# Altium integrated library WE_WR-MPC3_Micro Power Connector_3.00 mm_rev15c.IntLib: 173 symbols (part 2 of 2)
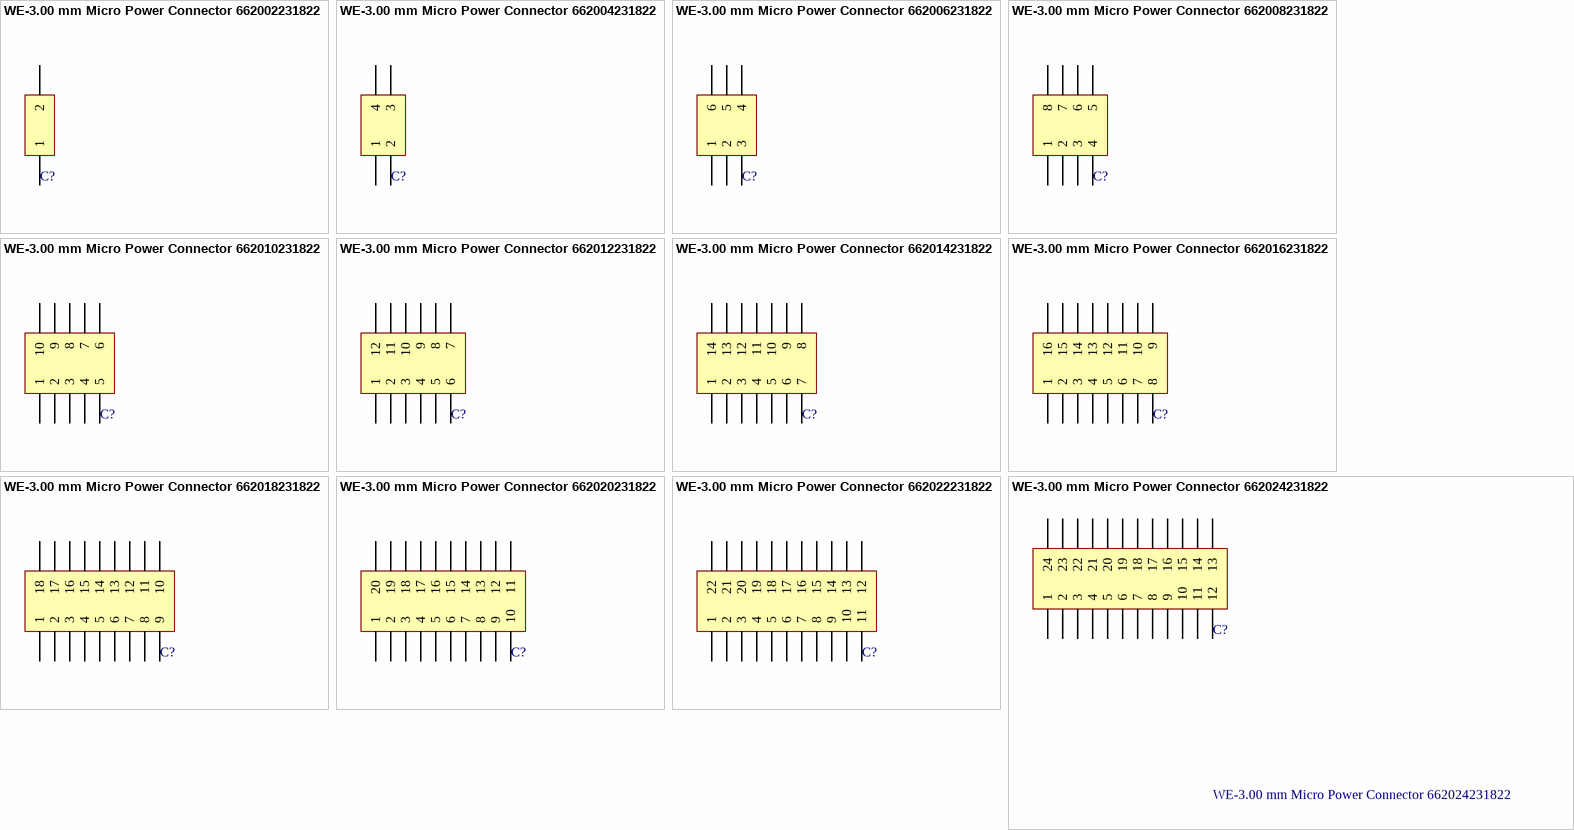
[diagram p17: symbols WE-3.00 mm Micro Power Connector 662002231822 to WE-3.00 mm Micro Power Connector 662024231822]

## WE-3.00 mm Micro Power Connector 662002231822
designator C?
WR-MPC3 3.00 mm Male Dual Row SMT Vertical Header with SMT Solder Tab; Manufacturer: Würth Elektronik eiSos GmbH; ComponentLink1 Description: Manufacturer; ComponentLink2 Description: Datasheet; NoPins: 02; Created Date: 30 July 2013; partNo: 662002231822; ComponentLink1URL: http://www.we-online.com; ComponentLink2URL: http://katalog.we-online.de/em/datasheet/6620xx231822.pdf; Created by: Karrer Zheng
footprint 662002231822 (Dual row SMT Vertical header With SMT Solder Tab 02p)
pins: 1, 2

## WE-3.00 mm Micro Power Connector 662004231822
designator C?
WR-MPC3 3.00 mm Male Dual Row SMT Vertical Header with SMT Solder Tab; Manufacturer: Würth Elektronik eiSos GmbH; ComponentLink1 Description: Manufacturer; ComponentLink2 Description: Datasheet; NoPins: 04; Created Date: 30 July 2013; partNo: 662004231822; ComponentLink1URL: http://www.we-online.com; ComponentLink2URL: http://katalog.we-online.de/em/datasheet/6620xx231822.pdf; Created by: Karrer Zheng
footprint 662004231822 (Dual row SMT Vertical header With SMT Solder Tab 04p)
pins: 1, 2, 3, 4

## WE-3.00 mm Micro Power Connector 662006231822
designator C?
WR-MPC3 3.00 mm Male Dual Row SMT Vertical Header with SMT Solder Tab; Manufacturer: Würth Elektronik eiSos GmbH; ComponentLink1 Description: Manufacturer; ComponentLink2 Description: Datasheet; NoPins: 06; Created Date: 30 July 2013; partNo: 662006231822; ComponentLink1URL: http://www.we-online.com; ComponentLink2URL: http://katalog.we-online.de/em/datasheet/6620xx231822.pdf; Created by: Karrer Zheng
footprint 662006231822 (Dual row SMT Vertical header With SMT Solder Tab 06p)
pins: 1, 2, 3, 4, 5, 6

## WE-3.00 mm Micro Power Connector 662008231822
designator C?
WR-MPC3 3.00 mm Male Dual Row SMT Vertical Header with SMT Solder Tab; Manufacturer: Würth Elektronik eiSos GmbH; ComponentLink1 Description: Manufacturer; ComponentLink2 Description: Datasheet; NoPins: 08; Created Date: 30 July 2013; partNo: 662008231822; ComponentLink1URL: http://www.we-online.com; ComponentLink2URL: http://katalog.we-online.de/em/datasheet/6620xx231822.pdf; Created by: Karrer Zheng
footprint 662008231822 (Dual row SMT Vertical header With SMT Solder Tab 08p)
pins: 1, 2, 3, 4, 5, 6, 7, 8

## WE-3.00 mm Micro Power Connector 662010231822
designator C?
WR-MPC3 3.00 mm Male Dual Row SMT Vertical Header with SMT Solder Tab; Manufacturer: Würth Elektronik eiSos GmbH; ComponentLink1 Description: Manufacturer; ComponentLink2 Description: Datasheet; NoPins: 10; Created Date: 30 July 2013; partNo: 662010231822; ComponentLink1URL: http://www.we-online.com; ComponentLink2URL: http://katalog.we-online.de/em/datasheet/6620xx231822.pdf; Created by: Karrer Zheng
footprint 662010231822 (Dual row SMT Vertical header With SMT Solder Tab 10p)
pins: 1, 2, 3, 4, 5, 6, 7, 8, 9, 10

## WE-3.00 mm Micro Power Connector 662012231822
designator C?
WR-MPC3 3.00 mm Male Dual Row SMT Vertical Header with SMT Solder Tab; Manufacturer: Würth Elektronik eiSos GmbH; ComponentLink1 Description: Manufacturer; ComponentLink2 Description: Datasheet; NoPins: 12; Created Date: 30 July 2013; partNo: 662012231822; ComponentLink1URL: http://www.we-online.com; ComponentLink2URL: http://katalog.we-online.de/em/datasheet/6620xx231822.pdf; Created by: Karrer Zheng
footprint 662012231822 (Dual row SMT Vertical header With SMT Solder Tab 12p)
pins: 1, 2, 3, 4, 5, 6, 7, 8, 9, 10, 11, 12

## WE-3.00 mm Micro Power Connector 662014231822
designator C?
WR-MPC3 3.00 mm Male Dual Row SMT Vertical Header with SMT Solder Tab; Manufacturer: Würth Elektronik eiSos GmbH; ComponentLink1 Description: Manufacturer; ComponentLink2 Description: Datasheet; NoPins: 14; Created Date: 30 July 2013; partNo: 662014231822; ComponentLink1URL: http://www.we-online.com; ComponentLink2URL: http://katalog.we-online.de/em/datasheet/6620xx231822.pdf; Created by: Karrer Zheng
footprint 662014231822 (Dual row SMT Vertical header With SMT Solder Tab 14p)
pins: 1, 2, 3, 4, 5, 6, 7, 8, 9, 10, 11, 12, 13, 14

## WE-3.00 mm Micro Power Connector 662016231822
designator C?
WR-MPC3 3.00 mm Male Dual Row SMT Vertical Header with SMT Solder Tab; Manufacturer: Würth Elektronik eiSos GmbH; ComponentLink1 Description: Manufacturer; ComponentLink2 Description: Datasheet; NoPins: 16; Created Date: 30 July 2013; partNo: 662016231822; ComponentLink1URL: http://www.we-online.com; ComponentLink2URL: http://katalog.we-online.de/em/datasheet/6620xx231822.pdf; Created by: Karrer Zheng
footprint 662016231822 (Dual row SMT Vertical header With SMT Solder Tab 16p)
pins: 1, 2, 3, 4, 5, 6, 7, 8, 9, 10, 11, 12, 13, 14, 15, 16

## WE-3.00 mm Micro Power Connector 662018231822
designator C?
WR-MPC3 3.00 mm Male Dual Row SMT Vertical Header with SMT Solder Tab; Manufacturer: Würth Elektronik eiSos GmbH; ComponentLink1 Description: Manufacturer; ComponentLink2 Description: Datasheet; NoPins: 18; Created Date: 30 July 2013; partNo: 662018231822; ComponentLink1URL: http://www.we-online.com; ComponentLink2URL: http://katalog.we-online.de/em/datasheet/6620xx231822.pdf; Created by: Karrer Zheng
footprint 662018231822 (Dual row SMT Vertical header With SMT Solder Tab 18p)
pins: 1, 2, 3, 4, 5, 6, 7, 8, 9, 10, 11, 12, 13, 14, 15, 16, 17, 18

## WE-3.00 mm Micro Power Connector 662020231822
designator C?
WR-MPC3 3.00 mm Male Dual Row SMT Vertical Header with SMT Solder Tab; Manufacturer: Würth Elektronik eiSos GmbH; ComponentLink1 Description: Manufacturer; ComponentLink2 Description: Datasheet; NoPins: 20; Created Date: 30 July 2013; partNo: 662020231822; ComponentLink1URL: http://www.we-online.com; ComponentLink2URL: http://katalog.we-online.de/em/datasheet/6620xx231822.pdf; Created by: Karrer Zheng
footprint 662020231822 (Dual row SMT Vertical header With SMT Solder Tab 20p)
pins: 1, 2, 3, 4, 5, 6, 7, 8, 9, 10, 11, 12, 13, 14, 15, 16, 17, 18, 19, 20

## WE-3.00 mm Micro Power Connector 662022231822
designator C?
WR-MPC3 3.00 mm Male Dual Row SMT Vertical Header with SMT Solder Tab; Manufacturer: Würth Elektronik eiSos GmbH; ComponentLink1 Description: Manufacturer; ComponentLink2 Description: Datasheet; NoPins: 22; Created Date: 30 July 2013; partNo: 662022231822; ComponentLink1URL: http://www.we-online.com; ComponentLink2URL: http://katalog.we-online.de/em/datasheet/6620xx231822.pdf; Created by: Karrer Zheng
footprint 662022231822 (Dual row SMT Vertical header With SMT Solder Tab 22p)
pins: 1, 2, 3, 4, 5, 6, 7, 8, 9, 10, 11, 12, 13, 14, 15, 16, 17, 18, 19, 20, 21, 22

## WE-3.00 mm Micro Power Connector 662024231822
designator C?
WR-MPC3 3.00 mm Male Dual Row SMT Vertical Header with SMT Solder Tab; Manufacturer: Würth Elektronik eiSos GmbH; ComponentLink1 Description: Manufacturer; ComponentLink2 Description: Datasheet; NoPins: 24; Created Date: 30 July 2013; partNo: 662024231822; ComponentLink1URL: http://www.we-online.com; ComponentLink2URL: http://katalog.we-online.de/em/datasheet/6620xx231822.pdf; Created by: Karrer Zheng
footprint 662024231822 (Dual row SMT Vertical header With SMT Solder Tab 24p)
pins: 1, 2, 3, 4, 5, 6, 7, 8, 9, 10, 11, 12, 13, 14, 15, 16, 17, 18, 19, 20, 21, 22, 23, 24


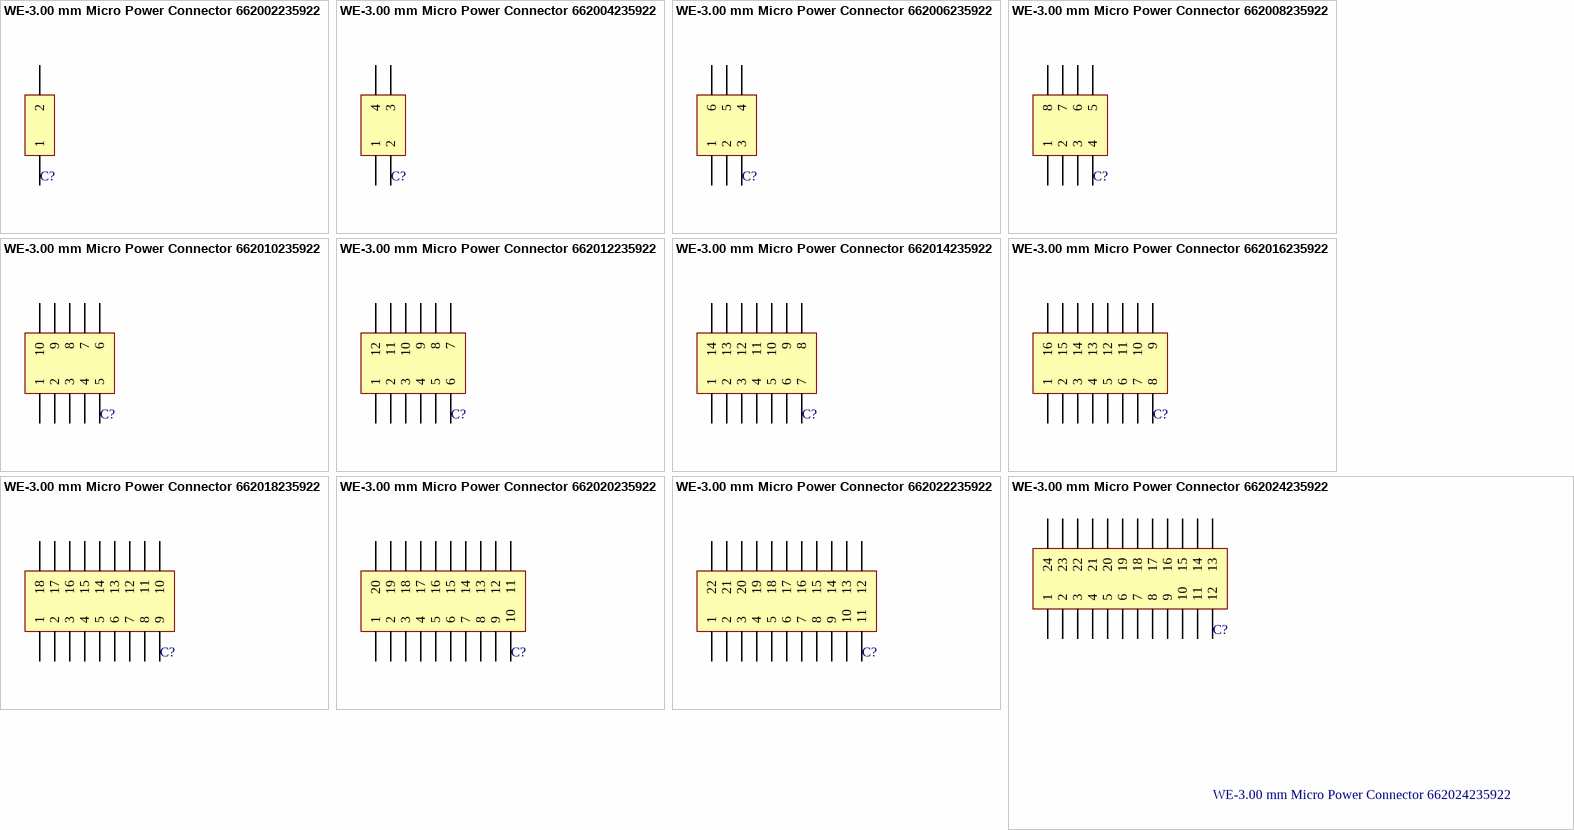
[diagram p14: symbols WE-3.00 mm Micro Power Connector 662002235922 to WE-3.00 mm Micro Power Connector 662024235922]

## WE-3.00 mm Micro Power Connector 662002235922
designator C?
WR-MPC3 3.00 mm Male Dual Row SMT Vertical Header with Through Hole Retention Clip; Manufacturer: Würth Elektronik eiSos GmbH; ComponentLink1 Description: Manufacturer; ComponentLink2 Description: Datasheet; NoPins: 02; Created Date: 30 July 2013; partNo: 662002235922; ComponentLink1URL: http://www.we-online.com; ComponentLink2URL: http://katalog.we-online.de/em/datasheet/6620xx235922.pdf; Created by: Karrer Zheng
footprint 662002235922 (Dual row SMT Vertical header With TH metal clip 02p)
pins: 1, 2

## WE-3.00 mm Micro Power Connector 662004235922
designator C?
WR-MPC3 3.00 mm Male Dual Row SMT Vertical Header with Through Hole Retention Clip; Manufacturer: Würth Elektronik eiSos GmbH; ComponentLink1 Description: Manufacturer; ComponentLink2 Description: Datasheet; NoPins: 04; Created Date: 30 July 2013; partNo: 662004235922; ComponentLink1URL: http://www.we-online.com; ComponentLink2URL: http://katalog.we-online.de/em/datasheet/6620xx235922.pdf; Created by: Karrer Zheng
footprint 662004235922 (Dual row SMT Vertical header With TH metal clip 04p)
pins: 1, 2, 3, 4

## WE-3.00 mm Micro Power Connector 662006235922
designator C?
WR-MPC3 3.00 mm Male Dual Row SMT Vertical Header with Through Hole Retention Clip; Manufacturer: Würth Elektronik eiSos GmbH; ComponentLink1 Description: Manufacturer; ComponentLink2 Description: Datasheet; NoPins: 6; Created Date: 30 July 2013; partNo: 662006235922; ComponentLink1URL: http://www.we-online.com; ComponentLink2URL: http://katalog.we-online.de/em/datasheet/6620xx235922.pdf; Created by: Karrer Zheng
footprint 662006235922 (Dual row SMT Vertical header With TH metal clip 06p)
pins: 1, 2, 3, 4, 5, 6

## WE-3.00 mm Micro Power Connector 662008235922
designator C?
WR-MPC3 3.00 mm Male Dual Row SMT Vertical Header with Through Hole Retention Clip; Manufacturer: Würth Elektronik eiSos GmbH; ComponentLink1 Description: Manufacturer; ComponentLink2 Description: Datasheet; NoPins: 08; Created Date: 30 July 2013; partNo: 662008235922; ComponentLink1URL: http://www.we-online.com; ComponentLink2URL: http://katalog.we-online.de/em/datasheet/6620xx235922.pdf; Created by: Karrer Zheng
footprint 662008235922 (Dual row SMT Vertical header With TH metal clip 08p)
pins: 1, 2, 3, 4, 5, 6, 7, 8

## WE-3.00 mm Micro Power Connector 662010235922
designator C?
WR-MPC3 3.00 mm Male Dual Row SMT Vertical Header with Through Hole Retention Clip; Manufacturer: Würth Elektronik eiSos GmbH; ComponentLink1 Description: Manufacturer; ComponentLink2 Description: Datasheet; NoPins: 10; Created Date: 30 July 2013; partNo: 662010235922; ComponentLink1URL: http://www.we-online.com; ComponentLink2URL: http://katalog.we-online.de/em/datasheet/6620xx235922.pdf; Created by: Karrer Zheng
footprint 662010235922 (Dual row SMT Vertical header With TH metal clip 10p)
pins: 1, 2, 3, 4, 5, 6, 7, 8, 9, 10

## WE-3.00 mm Micro Power Connector 662012235922
designator C?
WR-MPC3 3.00 mm Male Dual Row SMT Vertical Header with Through Hole Retention Clip; Manufacturer: Würth Elektronik eiSos GmbH; ComponentLink1 Description: Manufacturer; ComponentLink2 Description: Datasheet; NoPins: 12; Created Date: 30 July 2013; partNo: 662012235922; ComponentLink1URL: http://www.we-online.com; ComponentLink2URL: http://katalog.we-online.de/em/datasheet/6620xx235922.pdf; Created by: Karrer Zheng
footprint 662012235922 (Dual row SMT Vertical header With TH metal clip 12p)
pins: 1, 2, 3, 4, 5, 6, 7, 8, 9, 10, 11, 12

## WE-3.00 mm Micro Power Connector 662014235922
designator C?
WR-MPC3 3.00 mm Male Dual Row SMT Vertical Header with Through Hole Retention Clip; Manufacturer: Würth Elektronik eiSos GmbH; ComponentLink1 Description: Manufacturer; ComponentLink2 Description: Datasheet; NoPins: 14; Created Date: 30 July 2013; partNo: 662014235922; ComponentLink1URL: http://www.we-online.com; ComponentLink2URL: http://katalog.we-online.de/em/datasheet/6620xx235922.pdf; Created by: Karrer Zheng
footprint 662014235922 (Dual row SMT Vertical header With TH metal clip 14p)
pins: 1, 2, 3, 4, 5, 6, 7, 8, 9, 10, 11, 12, 13, 14

## WE-3.00 mm Micro Power Connector 662016235922
designator C?
WR-MPC3 3.00 mm Male Dual Row SMT Vertical Header with Through Hole Retention Clip; Manufacturer: Würth Elektronik eiSos GmbH; ComponentLink1 Description: Manufacturer; ComponentLink2 Description: Datasheet; NoPins: 16; Created Date: 30 July 2013; partNo: 662016235922; ComponentLink1URL: http://www.we-online.com; ComponentLink2URL: http://katalog.we-online.de/em/datasheet/6620xx235922.pdf; Created by: Karrer Zheng
footprint 662016235922 (Dual row SMT Vertical header With TH metal clip 16p)
pins: 1, 2, 3, 4, 5, 6, 7, 8, 9, 10, 11, 12, 13, 14, 15, 16

## WE-3.00 mm Micro Power Connector 662018235922
designator C?
WR-MPC3 3.00 mm Male Dual Row SMT Vertical Header with Through Hole Retention Clip; Manufacturer: Würth Elektronik eiSos GmbH; ComponentLink1 Description: Manufacturer; ComponentLink2 Description: Datasheet; NoPins: 18; Created Date: 30 July 2013; partNo: 662018235922; ComponentLink1URL: http://www.we-online.com; ComponentLink2URL: http://katalog.we-online.de/em/datasheet/6620xx235922.pdf; Created by: Karrer Zheng
footprint 662018235922 (Dual row SMT Vertical header With TH metal clip 18p)
pins: 1, 2, 3, 4, 5, 6, 7, 8, 9, 10, 11, 12, 13, 14, 15, 16, 17, 18

## WE-3.00 mm Micro Power Connector 662020235922
designator C?
WR-MPC3 3.00 mm Male Dual Row SMT Vertical Header with Through Hole Retention Clip; Manufacturer: Würth Elektronik eiSos GmbH; ComponentLink1 Description: Manufacturer; ComponentLink2 Description: Datasheet; NoPins: 20; Created Date: 30 July 2013; partNo: 662020235922; ComponentLink1URL: http://www.we-online.com; ComponentLink2URL: http://katalog.we-online.de/em/datasheet/6620xx235922.pdf; Created by: Karrer Zheng
footprint 662020235922 (Dual row SMT Vertical header With TH metal clip 20p)
pins: 1, 2, 3, 4, 5, 6, 7, 8, 9, 10, 11, 12, 13, 14, 15, 16, 17, 18, 19, 20

## WE-3.00 mm Micro Power Connector 662022235922
designator C?
WR-MPC3 3.00 mm Male Dual Row SMT Vertical Header with Through Hole Retention Clip; Manufacturer: Würth Elektronik eiSos GmbH; ComponentLink1 Description: Manufacturer; ComponentLink2 Description: Datasheet; NoPins: 22; Created Date: 30 July 2013; partNo: 662022235922; ComponentLink1URL: http://www.we-online.com; ComponentLink2URL: http://katalog.we-online.de/em/datasheet/6620xx235922.pdf; Created by: Karrer Zheng
footprint 662022235922 (Dual row SMT Vertical header With TH metal clip 22p)
pins: 1, 2, 3, 4, 5, 6, 7, 8, 9, 10, 11, 12, 13, 14, 15, 16, 17, 18, 19, 20, 21, 22

## WE-3.00 mm Micro Power Connector 662024235922
designator C?
WR-MPC3 3.00 mm Male Dual Row SMT Vertical Header with Through Hole Retention Clip; Manufacturer: Würth Elektronik eiSos GmbH; ComponentLink1 Description: Manufacturer; ComponentLink2 Description: Datasheet; NoPins: 24; Created Date: 30 July 2013; partNo: 662024235922; ComponentLink1URL: http://www.we-online.com; ComponentLink2URL: http://katalog.we-online.de/em/datasheet/6620xx235922.pdf; Created by: Karrer Zheng
footprint 662024235922 (Dual row SMT Vertical header With TH metal clip 24p)
pins: 1, 2, 3, 4, 5, 6, 7, 8, 9, 10, 11, 12, 13, 14, 15, 16, 17, 18, 19, 20, 21, 22, 23, 24


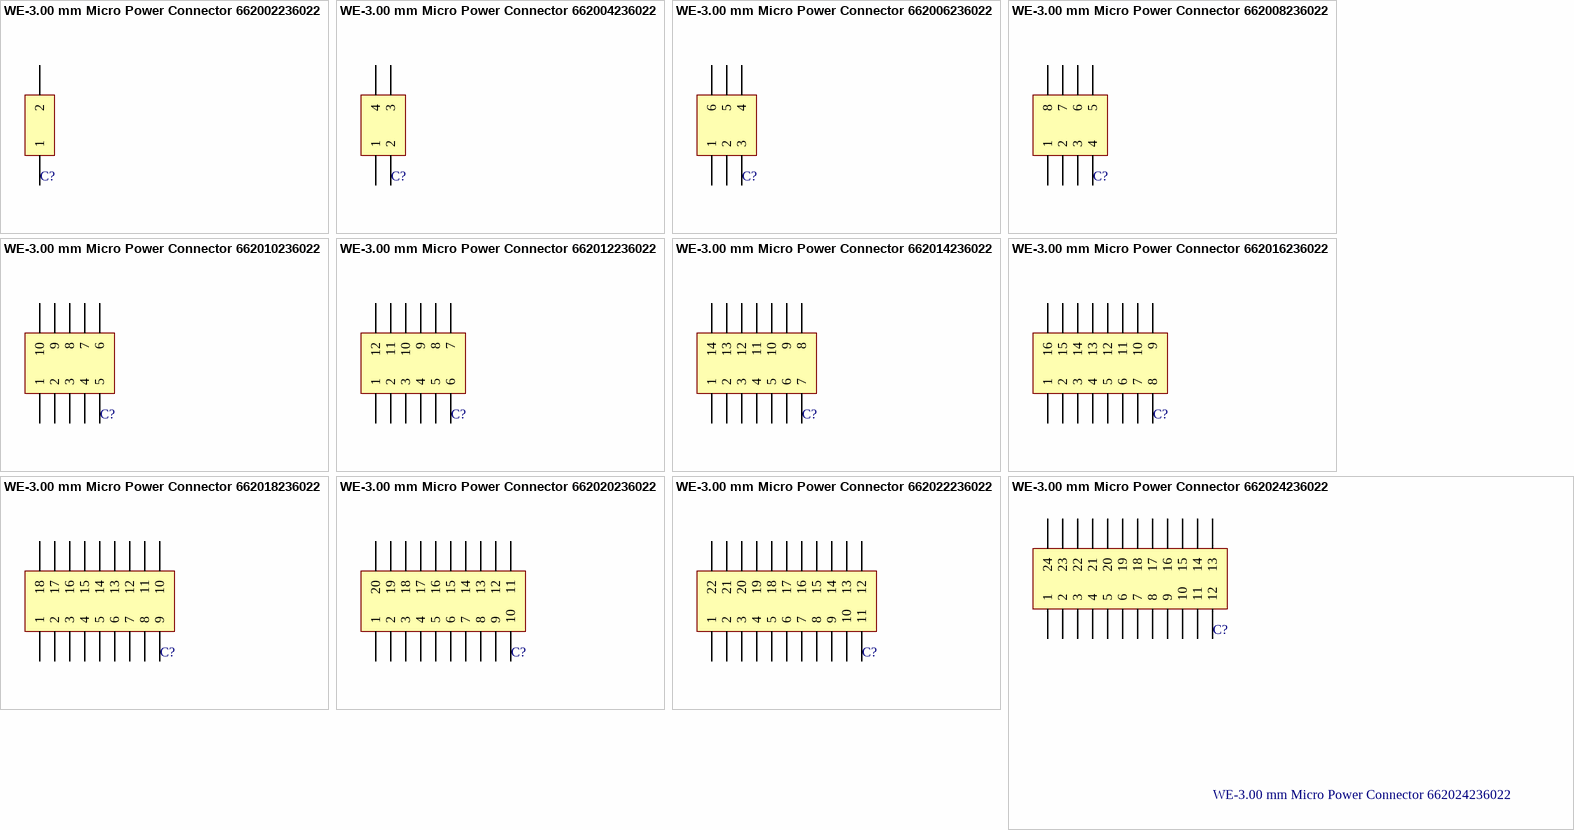
[diagram p15: symbols WE-3.00 mm Micro Power Connector 662002236022 to WE-3.00 mm Micro Power Connector 662024236022]

## WE-3.00 mm Micro Power Connector 662002236022
designator C?
WR-MPC3 3.00 mm Male Dual Row SMT Angled Header with Plastic Pegs; Manufacturer: Würth Elektronik eiSos GmbH; ComponentLink1 Description: Manufacturer; ComponentLink2 Description: Datasheet; NoPins: 02; Created Date: 20 August 2013; partNo: 662002236022; ComponentLink1URL: http://www.we-online.com; ComponentLink2URL: http://katalog.we-online.de/em/datasheet/6620xx236022.pdf; Created by: Karrer Zheng
footprint 662002236022 (Dual row SMT Right angle header With plastic peg 02p)
pins: 1, 2

## WE-3.00 mm Micro Power Connector 662004236022
designator C?
WR-MPC3 3.00 mm Male Dual Row SMT Angled Header with Plastic Pegs; Manufacturer: Würth Elektronik eiSos GmbH; ComponentLink1 Description: Manufacturer; ComponentLink2 Description: Datasheet; NoPins: 04; Created Date: 20 August 2013; partNo: 662004236022; ComponentLink1URL: http://www.we-online.com; ComponentLink2URL: http://katalog.we-online.de/em/datasheet/6620xx236022.pdf; Created by: Karrer Zheng
footprint 662004236022 (Dual row SMT Right angle header With plastic peg 04p)
pins: 1, 2, 3, 4

## WE-3.00 mm Micro Power Connector 662006236022
designator C?
WR-MPC3 3.00 mm Male Dual Row SMT Angled Header with Plastic Pegs; Manufacturer: Würth Elektronik eiSos GmbH; ComponentLink1 Description: Manufacturer; ComponentLink2 Description: Datasheet; NoPins: 06; Created Date: 20 August 2013; partNo: 662006236022; ComponentLink1URL: http://www.we-online.com; ComponentLink2URL: http://katalog.we-online.de/em/datasheet/6620xx236022.pdf; Created by: Karrer Zheng
footprint 662006236022 (Dual row SMT Right angle header With plastic peg 06p)
pins: 1, 2, 3, 4, 5, 6

## WE-3.00 mm Micro Power Connector 662008236022
designator C?
WR-MPC3 3.00 mm Male Dual Row SMT Angled Header with Plastic Pegs; Manufacturer: Würth Elektronik eiSos GmbH; ComponentLink1 Description: Manufacturer; ComponentLink2 Description: Datasheet; NoPins: 08; Created Date: 20 August 2013; partNo: 662008236022; ComponentLink1URL: http://www.we-online.com; ComponentLink2URL: http://katalog.we-online.de/em/datasheet/6620xx236022.pdf; Created by: Karrer Zheng
footprint 662008236022 (Dual row SMT Right angle header With plastic peg 08p)
pins: 1, 2, 3, 4, 5, 6, 7, 8

## WE-3.00 mm Micro Power Connector 662010236022
designator C?
WR-MPC3 3.00 mm Male Dual Row SMT Angled Header with Plastic Pegs; Manufacturer: Würth Elektronik eiSos GmbH; ComponentLink1 Description: Manufacturer; ComponentLink2 Description: Datasheet; NoPins: 10; Created Date: 20 August 2013; partNo: 662010236022; ComponentLink1URL: http://www.we-online.com; ComponentLink2URL: http://katalog.we-online.de/em/datasheet/6620xx236022.pdf; Created by: Karrer Zheng
footprint 662010236022 (Dual row SMT Right angle header With plastic peg 10p)
pins: 1, 2, 3, 4, 5, 6, 7, 8, 9, 10

## WE-3.00 mm Micro Power Connector 662012236022
designator C?
WR-MPC3 3.00 mm Male Dual Row SMT Angled Header with Plastic Pegs; Manufacturer: Würth Elektronik eiSos GmbH; ComponentLink1 Description: Manufacturer; ComponentLink2 Description: Datasheet; NoPins: 12; Created Date: 20 August 2013; partNo: 662012236022; ComponentLink1URL: http://www.we-online.com; ComponentLink2URL: http://katalog.we-online.de/em/datasheet/6620xx236022.pdf; Created by: Karrer Zheng
footprint 662012236022 (Dual row SMT Right angle header With plastic peg 12p)
pins: 1, 2, 3, 4, 5, 6, 7, 8, 9, 10, 11, 12

## WE-3.00 mm Micro Power Connector 662014236022
designator C?
WR-MPC3 3.00 mm Male Dual Row SMT Angled Header with Plastic Pegs; Manufacturer: Würth Elektronik eiSos GmbH; ComponentLink1 Description: Manufacturer; ComponentLink2 Description: Datasheet; NoPins: 14; Created Date: 20 August 2013; partNo: 662014236022; ComponentLink1URL: http://www.we-online.com; ComponentLink2URL: http://katalog.we-online.de/em/datasheet/6620xx236022.pdf; Created by: Karrer Zheng
footprint 662014236022 (Dual row SMT Right angle header With plastic peg 14p)
pins: 1, 2, 3, 4, 5, 6, 7, 8, 9, 10, 11, 12, 13, 14

## WE-3.00 mm Micro Power Connector 662016236022
designator C?
WR-MPC3 3.00 mm Male Dual Row SMT Angled Header with Plastic Pegs; Manufacturer: Würth Elektronik eiSos GmbH; ComponentLink1 Description: Manufacturer; ComponentLink2 Description: Datasheet; NoPins: 16; Created Date: 20 August 2013; partNo: 662016236022; ComponentLink1URL: http://www.we-online.com; ComponentLink2URL: http://katalog.we-online.de/em/datasheet/6620xx236022.pdf; Created by: Karrer Zheng
footprint 662016236022 (Dual row SMT Right angle header With plastic peg 16p)
pins: 1, 2, 3, 4, 5, 6, 7, 8, 9, 10, 11, 12, 13, 14, 15, 16

## WE-3.00 mm Micro Power Connector 662018236022
designator C?
WR-MPC3 3.00 mm Male Dual Row SMT Angled Header with Plastic Pegs; Manufacturer: Würth Elektronik eiSos GmbH; ComponentLink1 Description: Manufacturer; ComponentLink2 Description: Datasheet; NoPins: 18; Created Date: 20 August 2013; partNo: 662018236022; ComponentLink1URL: http://www.we-online.com; ComponentLink2URL: http://katalog.we-online.de/em/datasheet/6620xx236022.pdf; Created by: Karrer Zheng
footprint 662018236022 (Dual row SMT Right angle header With plastic peg 18p)
pins: 1, 2, 3, 4, 5, 6, 7, 8, 9, 10, 11, 12, 13, 14, 15, 16, 17, 18

## WE-3.00 mm Micro Power Connector 662020236022
designator C?
WR-MPC3 3.00 mm Male Dual Row SMT Angled Header with Plastic Pegs; Manufacturer: Würth Elektronik eiSos GmbH; ComponentLink1 Description: Manufacturer; ComponentLink2 Description: Datasheet; NoPins: 20; Created Date: 20 August 2013; partNo: 662020236022; ComponentLink1URL: http://www.we-online.com; ComponentLink2URL: http://katalog.we-online.de/em/datasheet/6620xx236022.pdf; Created by: Karrer Zheng
footprint 662020236022 (Dual row SMT Right angle header With plastic peg 20p)
pins: 1, 2, 3, 4, 5, 6, 7, 8, 9, 10, 11, 12, 13, 14, 15, 16, 17, 18, 19, 20

## WE-3.00 mm Micro Power Connector 662022236022
designator C?
WR-MPC3 3.00 mm Male Dual Row SMT Angled Header with Plastic Pegs; Manufacturer: Würth Elektronik eiSos GmbH; ComponentLink1 Description: Manufacturer; ComponentLink2 Description: Datasheet; NoPins: 22; Created Date: 20 August 2013; partNo: 662022236022; ComponentLink1URL: http://www.we-online.com; ComponentLink2URL: http://katalog.we-online.de/em/datasheet/6620xx236022.pdf; Created by: Karrer Zheng
footprint 662022236022 (Dual row SMT Right angle header With plastic peg 22p)
pins: 1, 2, 3, 4, 5, 6, 7, 8, 9, 10, 11, 12, 13, 14, 15, 16, 17, 18, 19, 20, 21, 22

## WE-3.00 mm Micro Power Connector 662024236022
designator C?
WR-MPC3 3.00 mm Male Dual Row SMT Angled Header with Plastic Pegs; Manufacturer: Würth Elektronik eiSos GmbH; ComponentLink1 Description: Manufacturer; ComponentLink2 Description: Datasheet; NoPins: 24; Created Date: 20 August 2013; partNo: 662024236022; ComponentLink1URL: http://www.we-online.com; ComponentLink2URL: http://katalog.we-online.de/em/datasheet/6620xx236022.pdf; Created by: Karrer Zheng
footprint 662024236022 (Dual row SMT Right angle header With plastic peg 24p)
pins: 1, 2, 3, 4, 5, 6, 7, 8, 9, 10, 11, 12, 13, 14, 15, 16, 17, 18, 19, 20, 21, 22, 23, 24


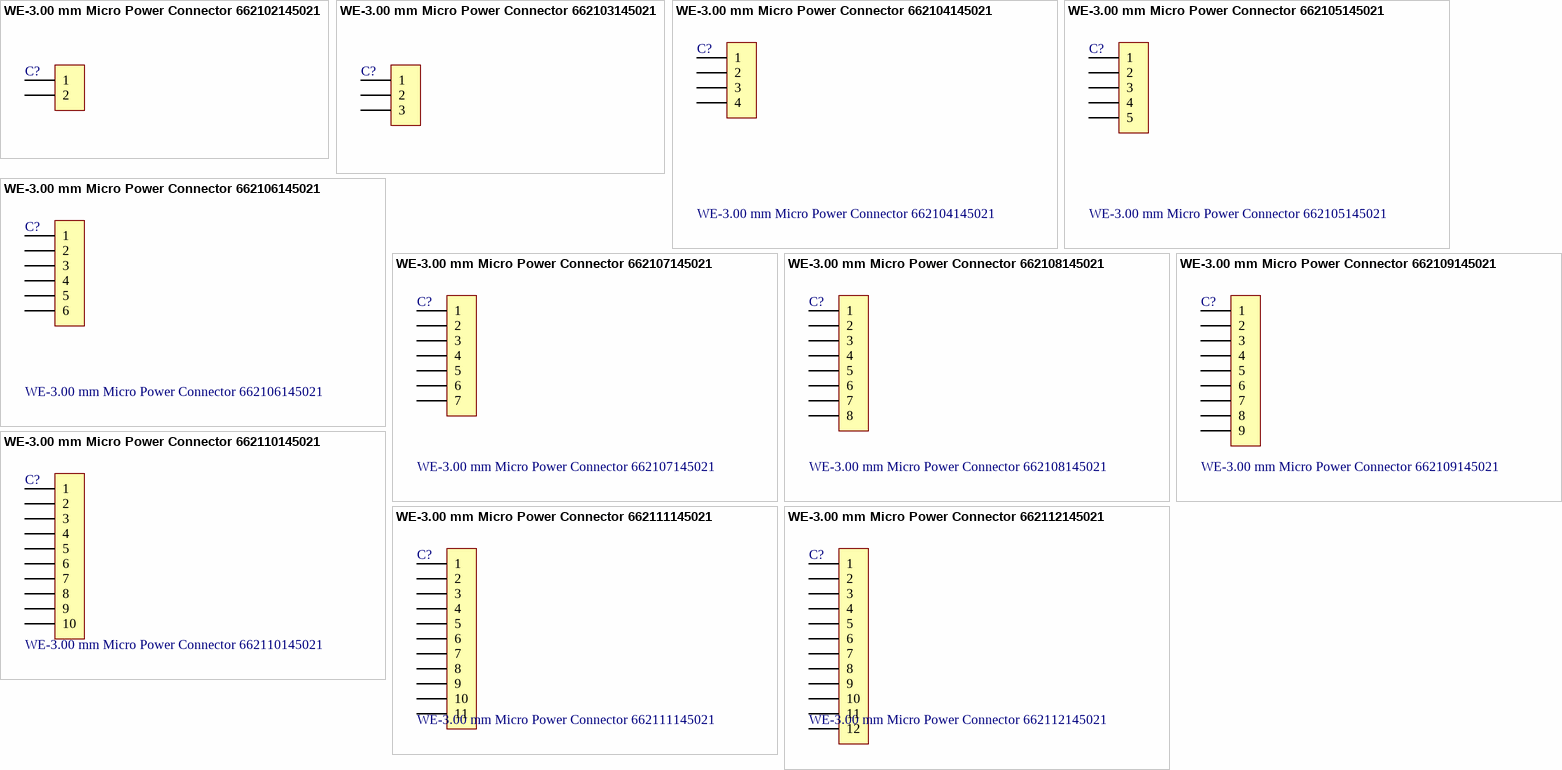
[diagram p16: symbols WE-3.00 mm Micro Power Connector 662102145021 to WE-3.00 mm Micro Power Connector 662112145021]

## WE-3.00 mm Micro Power Connector 662102145021
designator C?
WR-MPC3 3.00 mm Male Single Row SMT Angled Header; Manufacturer: Würth Elektronik eiSos GmbH; ComponentLink1 Description: Manufacturer; ComponentLink2 Description: Datasheet; NoPins: 02; Created Date: 28 August 2013; partNo: 662102145021; ComponentLink1URL: http://www.we-online.com; ComponentLink2URL: http://katalog.we-online.de/em/datasheet/6621xx145021.pdf; Created by: Karrer Zheng
footprint 662102145021 (Single row Right angle header SMT Solder tab 02p)
pins: 1, 2

## WE-3.00 mm Micro Power Connector 662103145021
designator C?
WR-MPC3 3.00 mm Male Single Row SMT Angled Header; Manufacturer: Würth Elektronik eiSos GmbH; ComponentLink1 Description: Manufacturer; ComponentLink2 Description: Datasheet; NoPins: 03; Created Date: 28 August 2013; partNo: 662103145021; ComponentLink1URL: http://www.we-online.com; ComponentLink2URL: http://katalog.we-online.de/em/datasheet/6621xx145021.pdf; Created by: Karrer Zheng
footprint 662103145021 (Single row Right angle header SMT Solder tab 03p)
pins: 1, 2, 3

## WE-3.00 mm Micro Power Connector 662104145021
designator C?
WR-MPC3 3.00 mm Male Single Row SMT Angled Header; Manufacturer: Würth Elektronik eiSos GmbH; ComponentLink1 Description: Manufacturer; ComponentLink2 Description: Datasheet; NoPins: 04; Created Date: 28 August 2013; partNo: 662104145021; ComponentLink1URL: http://www.we-online.com; ComponentLink2URL: http://katalog.we-online.de/em/datasheet/6621xx145021.pdf; Created by: Karrer Zheng
footprint 662104145021 (Single row Right angle header SMT Solder tab 04p)
pins: 1, 2, 3, 4

## WE-3.00 mm Micro Power Connector 662105145021
designator C?
WR-MPC3 3.00 mm Male Single Row SMT Angled Header; Manufacturer: Würth Elektronik eiSos GmbH; ComponentLink1 Description: Manufacturer; ComponentLink2 Description: Datasheet; NoPins: 05; Created Date: 28 August 2013; partNo: 662105145021; ComponentLink1URL: http://www.we-online.com; ComponentLink2URL: http://katalog.we-online.de/em/datasheet/6621xx145021.pdf; Created by: Karrer Zheng
footprint 662105145021 (Single row Right angle header SMT Solder tab 05p)
pins: 1, 2, 3, 4, 5

## WE-3.00 mm Micro Power Connector 662106145021
designator C?
WR-MPC3 3.00 mm Male Single Row SMT Angled Header; Manufacturer: Würth Elektronik eiSos GmbH; ComponentLink1 Description: Manufacturer; ComponentLink2 Description: Datasheet; NoPins: 06; Created Date: 28 August 2013; partNo: 662106145021; ComponentLink1URL: http://www.we-online.com; ComponentLink2URL: http://katalog.we-online.de/em/datasheet/6621xx145021.pdf; Created by: Karrer Zheng
footprint 662106145021 (Single row Right angle header SMT Solder tab 06p)
pins: 1, 2, 3, 4, 5, 6

## WE-3.00 mm Micro Power Connector 662107145021
designator C?
WR-MPC3 3.00 mm Male Single Row SMT Angled Header; Manufacturer: Würth Elektronik eiSos GmbH; ComponentLink1 Description: Manufacturer; ComponentLink2 Description: Datasheet; NoPins: 07; Created Date: 28 August 2013; partNo: 662107145021; ComponentLink1URL: http://www.we-online.com; ComponentLink2URL: http://katalog.we-online.de/em/datasheet/6621xx145021.pdf; Created by: Karrer Zheng
footprint 662107145021 (Single row Right angle header SMT Solder tab 07p)
pins: 1, 2, 3, 4, 5, 6, 7

## WE-3.00 mm Micro Power Connector 662108145021
designator C?
WR-MPC3 3.00 mm Male Single Row SMT Angled Header; Manufacturer: Würth Elektronik eiSos GmbH; ComponentLink1 Description: Manufacturer; ComponentLink2 Description: Datasheet; NoPins: 08; Created Date: 28 August 2013; partNo: 662108145021; ComponentLink1URL: http://www.we-online.com; ComponentLink2URL: http://katalog.we-online.de/em/datasheet/6621xx145021.pdf; Created by: Karrer Zheng
footprint 662108145021 (Single row Right angle header SMT Solder tab 08p)
pins: 1, 2, 3, 4, 5, 6, 7, 8

## WE-3.00 mm Micro Power Connector 662109145021
designator C?
WR-MPC3 3.00 mm Male Single Row SMT Angled Header; Manufacturer: Würth Elektronik eiSos GmbH; ComponentLink1 Description: Manufacturer; ComponentLink2 Description: Datasheet; NoPins: 09; Created Date: 28 August 2013; partNo: 662109145021; ComponentLink1URL: http://www.we-online.com; ComponentLink2URL: http://katalog.we-online.de/em/datasheet/6621xx145021.pdf; Created by: Karrer Zheng
footprint 662109145021 (Single row Right angle header SMT Solder tab 09p)
pins: 1, 2, 3, 4, 5, 6, 7, 8, 9

## WE-3.00 mm Micro Power Connector 662110145021
designator C?
WR-MPC3 3.00 mm Male Single Row SMT Angled Header; Manufacturer: Würth Elektronik eiSos GmbH; ComponentLink1 Description: Manufacturer; ComponentLink2 Description: Datasheet; NoPins: 10; Created Date: 28 August 2013; partNo: 662110145021; ComponentLink1URL: http://www.we-online.com; ComponentLink2URL: http://katalog.we-online.de/em/datasheet/6621xx145021.pdf; Created by: Karrer Zheng
footprint 662110145021 (Single row Right angle header SMT Solder tab 10p)
pins: 1, 2, 3, 4, 5, 6, 7, 8, 9, 10

## WE-3.00 mm Micro Power Connector 662111145021
designator C?
WR-MPC3 3.00 mm Male Single Row SMT Angled Header; Manufacturer: Würth Elektronik eiSos GmbH; ComponentLink1 Description: Manufacturer; ComponentLink2 Description: Datasheet; NoPins: 11; Created Date: 28 August 2013; partNo: 662111145021; ComponentLink1URL: http://www.we-online.com; ComponentLink2URL: http://katalog.we-online.de/em/datasheet/6621xx145021.pdf; Created by: Karrer Zheng
footprint 662111145021 (Single row Right angle header SMT Solder tab 11p)
pins: 1, 2, 3, 4, 5, 6, 7, 8, 9, 10, 11

## WE-3.00 mm Micro Power Connector 662112145021
designator C?
WR-MPC3 3.00 mm Male Single Row SMT Angled Header; Manufacturer: Würth Elektronik eiSos GmbH; ComponentLink1 Description: Manufacturer; ComponentLink2 Description: Datasheet; NoPins: 12; Created Date: 28 August 2013; partNo: 662112145021; ComponentLink1URL: http://www.we-online.com; ComponentLink2URL: http://katalog.we-online.de/em/datasheet/6621xx145021.pdf; Created by: Karrer Zheng
footprint 662112145021 (Single row Right angle header SMT Solder tab 12p)
pins: 1, 2, 3, 4, 5, 6, 7, 8, 9, 10, 11, 12